# Altium footprint library Kelboy.PcbLib: 46 footprints (part 3 of 3)
Each footprint in its own frame and in the unit in brackets; x right, y up, seen from the top. Pads: shape width x height; smd on the part's side, far side on the other; paste and mask are expansions set on the pad; w line width, h text height; cw(c..) or ccw(c..) is an arc to the next point about the centre after c.
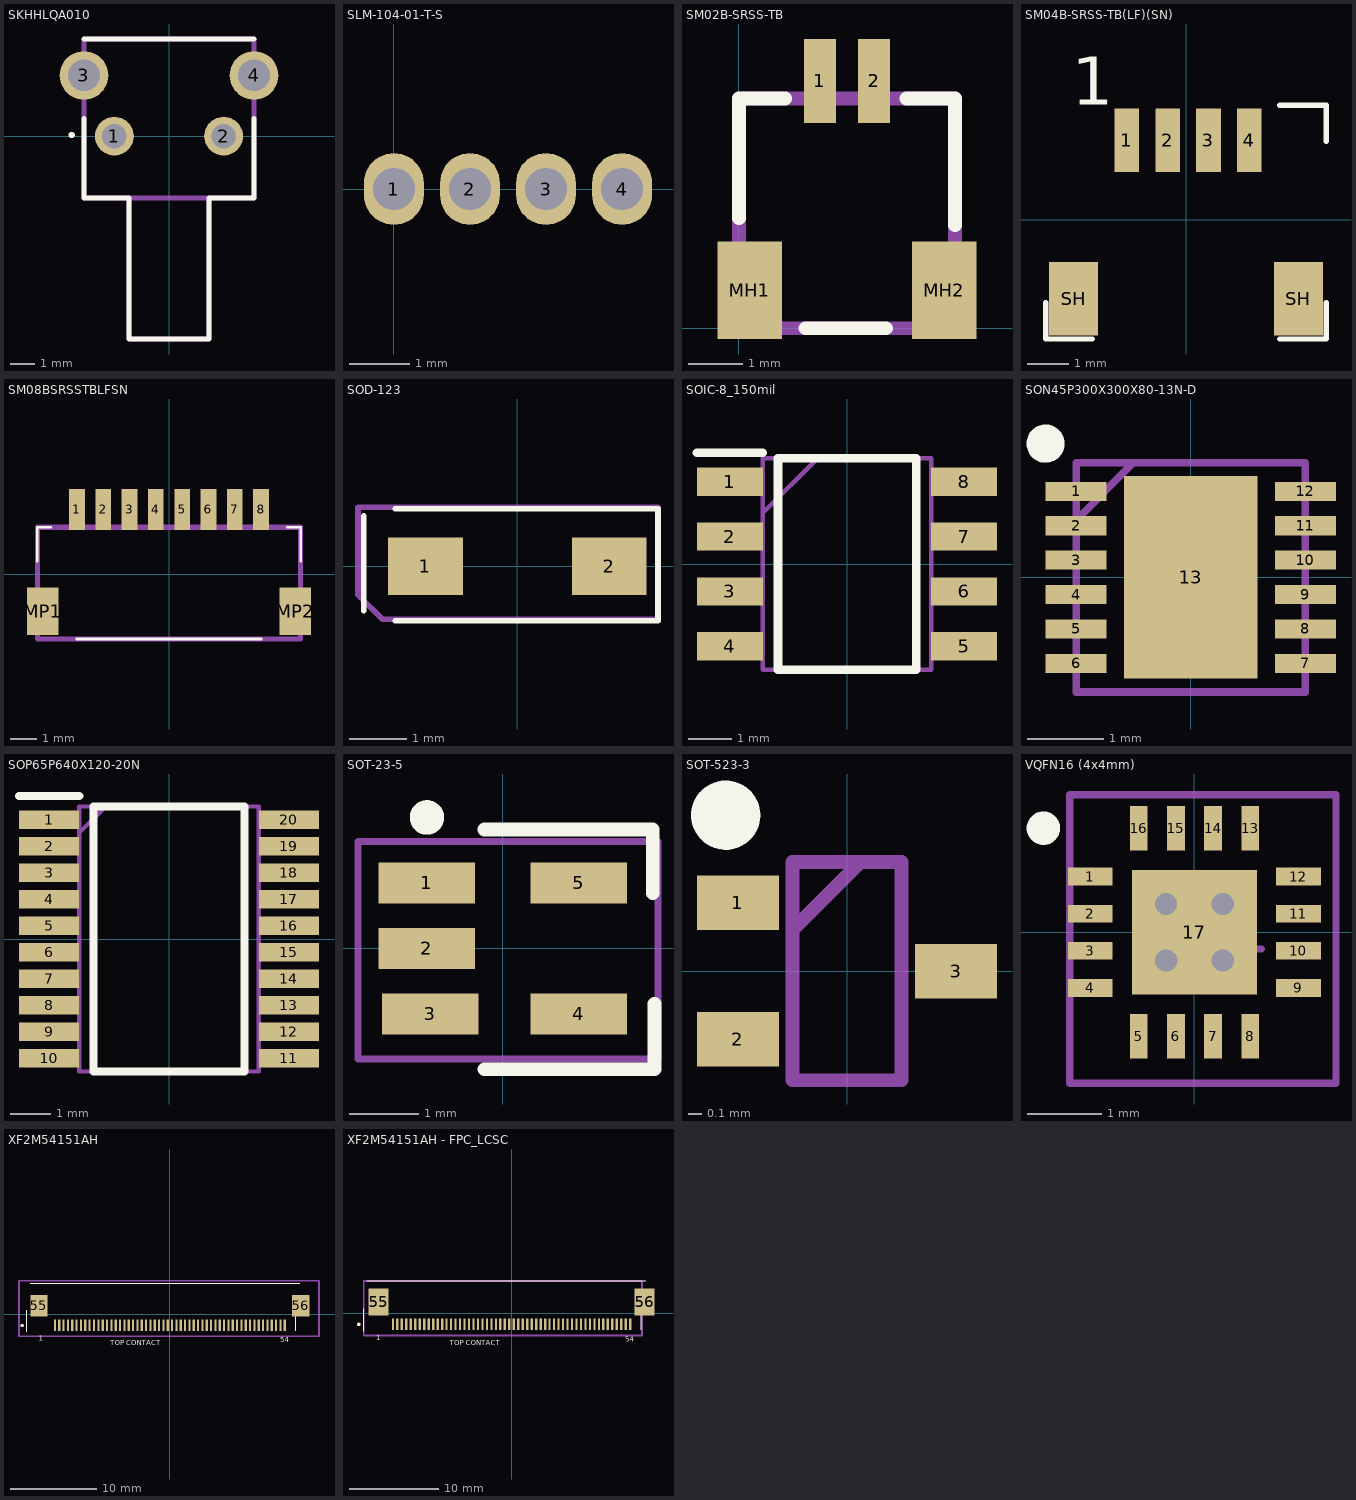
[diagram p2: the footprints below, top view; thin cyan lines are the x and y axes]

## SKHHLQA010 [mm]
pads (4):
  round 1.6 hole 1: 1(-2.25,0) 2(2.25,0)
  round 2 hole 1.3: 3(-3.5,2.5) 4(3.5,2.5)
Top Overlay:
  circle w0.2: c-4.01,0.048 r0.031
  lines w0.2: -3.5,0.725 -3.5,-2.55 -1.65,-2.55 -1.65,-8.35 1.65,-8.35 1.65,-2.55 3.5,-2.55 3.5,0.725 ; -3.5,4 3.5,4
Mechanical 13:
  lines w0.2: -1.65,-2.55 -1.65,-8.35 1.65,-8.35 1.65,-2.55 ; -3.5,-2.55 3.5,-2.55 3.5,4 -3.5,4 -3.5,-2.55
Mechanical 29:
  text ".Designator" at -1.905,0 h1
3D body "SKHHLQA010.stp": height 7.5, standoff -3.4, extent -4.25,-8.387 4.25,4.013

## SLM-104-01-T-S [mm]
pads (4):
  oval 1x1.2 hole 0.7: 1(0,0) 2(1.27,0) 3(2.54,0) 4(3.81,0)
Mechanical 29:
  text ".Designator" at -0.127,-0.254 h1
3D body "SLM-104-01-G-S.stp": height 4.57, standoff -2.92, extent -0.749,-1.27 4.559,1.27

## SM02B-SRSS-TB [mm]
pads (4):
  rect 0.6x1.55 smd: 1(1.5,4.575) 2(2.5,4.575)
  rect 1.2x1.8 smd: MH1(0.2,0.7) MH2(3.8,0.7)
Top Overlay:
  lines w0.254: 0,2.037 0,4.25 0.855,4.25 ; 1.233,0 2.722,0 ; 3.1,4.25 4,4.25 4,1.903
Mechanical 13:
  lines w0.254: 0,0 4,0 4,4.25 0,4.25 0,0
Mechanical 29:
  text ".Designator" at 0,2.475 h1
3D body "JST_SM02B-SRSS-TB.step": height 3, standoff 0, extent 0.038,0 4.026,4.987

## SM04B-SRSS-TB(LF)(SN) [mm]
pads (6):
  rect 0.6x1.55 smd: 1(-1.45,1.938) 2(-0.45,1.938) 3(0.55,1.938) 4(1.55,1.938)
  rect 1.2x1.8 smd: SH(-2.75,-1.937) SH(2.75,-1.937)
Top Overlay:
  lines w0.127: -3.429,-2.032 -3.429,-2.921 -2.286,-2.921 ; 2.286,-2.921 3.429,-2.921 3.429,-2.032 ; 2.286,2.794 3.429,2.794 3.429,1.905
  text "1" at -2.794,2.413 h2
3D body "SM04B-SRSS-TB(LF)(SN)--3DModel-STEP-56544.STEP": height 2.96, standoff 0, extent -3,-2.794 3,2.156

## SM08BSRSSTBLFSN [mm]
pads (10):
  rect 0.6x1.55 smd: 1(-3.5,2.463) 2(-2.5,2.463) 3(-1.5,2.463) 4(-0.5,2.463) 5(0.5,2.463) 6(1.5,2.463) 7(2.5,2.463) 8(3.5,2.463)
  rect 1.2x1.8 smd: MP1(-4.8,-1.413) MP2(4.8,-1.413)
Top Overlay:
  lines w0.1: -5,0.5 -5,1.787 -4.5,1.787 ; -3.5,-2.463 3.5,-2.463 ; 4.5,1.787 5,1.787 5,0.5
Mechanical 13:
  lines w0.2: -5,-2.463 -5,1.787 5,1.787 5,-2.463 -5,-2.463
Mechanical 29:
  text ".Designator" at -2.286,-1.27 h1
3D body "SM08B-SRSS-TB(LF)(SN)--3DModel-STEP-56544.STEP": height 3, standoff 0.05, extent -5,-2.032 5,2.918

## SOD-123 [mm]
pads (2):
  rect 1.3x1 smd: 1(-1.6,0) 2(1.6,0)
Top Overlay:
  lines w0.1: -2.675,-0.775 -2.675,0.875 ; -2.125,-0.95 2.45,-0.95 2.45,1 -2.125,1
Mechanical 29:
  lines w0.1: -2.775,-0.5 -2.775,1.025 2.45,1.025 2.45,-0.925 -2.35,-0.925 -2.775,-0.5
  text ".Designator" at -1.8,-0.35 h1
3D body "SOD-123FL.STEP": height 0.95, standoff 0, extent -1.825,-0.825 1.775,0.825

## SOIC-8_150mil [mm]
pads (8):
  rect 1.525x0.65 smd: 1(-2.712,1.905) 2(-2.712,0.635) 3(-2.712,-0.635) 4(-2.712,-1.905) 5(2.712,-1.905) 6(2.712,-0.635) 7(2.712,0.635) 8(2.712,1.905)
Top Overlay:
  lines w0.2: -3.475,2.58 -1.95,2.58 ; -1.6,-2.45 -1.6,2.45 1.6,2.45 1.6,-2.45 -1.6,-2.45
Mechanical 29:
  lines w0.1: -1.95,1.18 -0.68,2.45 ; -1.95,-2.45 1.95,-2.45 1.95,2.45 -1.95,2.45 -1.95,-2.45
  text ".Designator" at 48.78,-36.605 h1
3D body "NE555DR.stp": height 1.75, standoff 0, extent -3,-2.45 3,2.45

## SON45P300X300X80-13N-D [mm]
pads (13):
  rect 0.8x0.25 smd: 1(-1.5,1.125) 2(-1.5,0.675) 3(-1.5,0.225) 4(-1.5,-0.225) 5(-1.5,-0.675) 6(-1.5,-1.125) 7(1.5,-1.125) 8(1.5,-0.675) 9(1.5,-0.225) 10(1.5,0.225) 11(1.5,0.675) 12(1.5,1.125)
  rect 1.75x2.65 smd: 13(0,0)
Top Overlay:
  circle w0.25: c-1.9,1.75 r0.125
Mechanical 29:
  lines w0.1: -1.5,0.75 -0.75,1.5 ; -1.5,-1.5 -1.5,1.5 1.5,1.5 1.5,-1.5 -1.5,-1.5
  text ".Designator" at -1.143,-0.635 h1
3D body "RT8020AGQW.stp": height 0.8, standoff 0, extent -1.55,-1.5 1.55,1.5

## SOP65P640X120-20N [mm]
pads (20):
  rect 1.475x0.45 smd: 1(-2.938,2.925) 2(-2.938,2.275) 3(-2.938,1.625) 4(-2.938,0.975) 5(-2.938,0.325) 6(-2.938,-0.325) 7(-2.938,-0.975) 8(-2.938,-1.625) 9(-2.938,-2.275) 10(-2.938,-2.925) 11(2.938,-2.925) 12(2.938,-2.275) 13(2.938,-1.625) 14(2.938,-0.975) 15(2.938,-0.325) 16(2.938,0.325) 17(2.938,0.975) 18(2.938,1.625) 19(2.938,2.275) 20(2.938,2.925)
Top Overlay:
  lines w0.2: -3.675,3.5 -2.2,3.5 ; -1.85,-3.25 -1.85,3.25 1.85,3.25 1.85,-3.25 -1.85,-3.25
Mechanical 29:
  lines w0.1: -2.2,2.6 -1.55,3.25 ; -2.2,-3.25 2.2,-3.25 2.2,3.25 -2.2,3.25 -2.2,-3.25
  text ".Designator" at -1.905,-0.381 h1
3D body "PCM5102APWR.stp": height 1.2, standoff 0, extent -3.2,-3.25 3.2,3.25

## SOT-23-5 [mm] "SOT23, 3-Leads, Body 2.92x1.3mm, Pitch 0.95mm"
height 1.11
pads (5):
  rect 1.4x0.6 smd: 1(-1.1,0.95) 2(-1.1,0) 3(-1.05,-0.95) 4(1.1,-0.95) 5(1.1,0.95)
Top Overlay:
  circle w0.25: c-1.1,1.9 r0.125
  lines w0.2: -0.265,-1.75 2.2,-1.75 2.2,-0.8 ; -0.265,1.725 2.175,1.725 2.175,0.8
Mechanical 29:
  lines w0.1: -2.1,-1.6 -2.1,1.55 2.25,1.55 2.25,-1.6 -2.1,-1.6
  text ".Designator" at -0.9,1.125 h1
3D body "SOT-23-5.step": height 1.05, standoff -0.05, extent -1.175,-1.5 1.325,1.5

## SOT-523-3 [mm]
pads (3):
  rect 0.6x0.4 smd: 1(-0.8,0.5) 2(-0.8,-0.5) 3(0.8,0)
Top Overlay:
  circle w0.254: c-0.889,1.143 r0.127
Mechanical 29:
  lines w0.1: -0.4,0.3 0.1,0.8 ; -0.4,-0.8 -0.4,0.8 0.4,0.8 0.4,-0.8 -0.4,-0.8
  text ".Designator" at -1.397,-0.381 h1
3D body "DMG1012T-7.stp": height 0.8, standoff 0, extent -0.8,-0.8 0.8,0.8

## VQFN16 (4x4mm) [mm] "QFN, 16-Leads, Body 4,00x4,00mm,"
height 0.8
pads (17):
  rect 0.6x0.24 smd: 1(-1.4,0.75) 2(-1.4,0.25) 3(-1.4,-0.25) 4(-1.4,-0.75) 9(1.4,-0.75) 10(1.4,-0.25) 11(1.4,0.25) 12(1.4,0.75)
  rect 0.24x0.6 smd: 5(-0.75,-1.4) 6(-0.25,-1.4) 7(0.25,-1.4) 8(0.75,-1.4) 13(0.75,1.4) 14(0.25,1.4) 15(-0.25,1.4) 16(-0.75,1.4)
  rect 1.68x1.68 smd: 17(0,0)
via -0.384,0.381 diameter 0.5 hole 0.3
via 0.381,0.381 diameter 0.5 hole 0.3
via 0.381,-0.381 diameter 0.5 hole 0.3
via -0.381,-0.381 diameter 0.5 hole 0.3
Top Overlay:
  circle w0.25: c-2.032,1.4 r0.1
Mechanical 15:
  lines w0.1: -0.1,-0.225 0.9,-0.225 ; 0.4,-0.725 0.4,0.275
Mechanical 29:
  lines w0.1: -1.675,-2.032 1.905,-2.032 1.905,1.85 -1.675,1.85 -1.675,-2.032
  text ".Designator" at -1.124,-0.606 h1
3D body "BQ24076RGTT.stp": height 1, standoff 0, extent -1.55,-1.55 1.55,1.55

## XF2M54151AH [mm]
pads (56):
  rect 0.25x1.3 smd: 1(-13.25,-1.25) 2(-12.75,-1.25) 3(-12.25,-1.25) 4(-11.75,-1.25) 5(-11.25,-1.25) 6(-10.75,-1.25) 7(-10.25,-1.25) 8(-9.75,-1.25) 9(-9.25,-1.25) 10(-8.75,-1.25) 11(-8.25,-1.25) 12(-7.75,-1.25) 13(-7.25,-1.25) 14(-6.75,-1.25) 15(-6.25,-1.25) 16(-5.75,-1.25) 17(-5.25,-1.25) 18(-4.75,-1.25) 19(-4.25,-1.25) 20(-3.75,-1.25) 21(-3.25,-1.25) 22(-2.75,-1.25) 23(-2.25,-1.25) 24(-1.75,-1.25) 25(-1.25,-1.25) 26(-0.75,-1.25) 27(-0.25,-1.25) 28(0.25,-1.25) 29(0.75,-1.25) 30(1.25,-1.25) 31(1.75,-1.25) 32(2.25,-1.25) 33(2.75,-1.25) 34(3.25,-1.25) 35(3.75,-1.25) 36(4.25,-1.25) 37(4.75,-1.25) 38(5.25,-1.25) 39(5.75,-1.25) 40(6.25,-1.25) 41(6.75,-1.25) 42(7.25,-1.25) 43(7.75,-1.25) 44(8.25,-1.25) 45(8.75,-1.25) 46(9.25,-1.25) 47(9.75,-1.25) 48(10.25,-1.25) 49(10.75,-1.25) 50(11.25,-1.25) 51(11.75,-1.25) 52(12.25,-1.25) 53(12.75,-1.25) 54(13.25,-1.25)
  rect 2x2.5 smd: 55(-15.1,1) 56(15.1,1)
Top Overlay:
  lines w0.1: -16.494,-2.009 -16.494,0.491 ; -16.113,3.579 14.987,3.579 ; 14.494,-1.882 14.494,0.618
  lines w0.2: -17.145,-1.27 cw(c-17.045,-1.27) -16.945,-1.27 cw(c-17.045,-1.27) -17.042,-1.17
  text "TOP CONTACT" at -6.884,-3.79 h1
  text "1" at -15.097,-3.279 h1
  text "54" at 12.716,-3.406 h1
Mechanical 13:
  lines w0.2: -17.4,-2.517 -17.4,3.9 17.2,3.9 17.2,-2.517 -17.4,-2.517
Mechanical 29:
  text ".Designator" at -6.969,0.404 h1
3D body "f32q_54pin_asm.stp": height 2.1, standoff 0.05, extent -17.15,-1.55 17.15,3.95

## XF2M54151AH - FPC_LCSC [mm]
pads (56):
  rect 0.25x1.3 smd: 1(-13.25,-1.25) 2(-12.75,-1.25) 3(-12.25,-1.25) 4(-11.75,-1.25) 5(-11.25,-1.25) 6(-10.75,-1.25) 7(-10.25,-1.25) 8(-9.75,-1.25) 9(-9.25,-1.25) 10(-8.75,-1.25) 11(-8.25,-1.25) 12(-7.75,-1.25) 13(-7.25,-1.25) 14(-6.75,-1.25) 15(-6.25,-1.25) 16(-5.75,-1.25) 17(-5.25,-1.25) 18(-4.75,-1.25) 19(-4.25,-1.25) 20(-3.75,-1.25) 21(-3.25,-1.25) 22(-2.75,-1.25) 23(-2.25,-1.25) 24(-1.75,-1.25) 25(-1.25,-1.25) 26(-0.75,-1.25) 27(-0.25,-1.25) 28(0.25,-1.25) 29(0.75,-1.25) 30(1.25,-1.25) 31(1.75,-1.25) 32(2.25,-1.25) 33(2.75,-1.25) 34(3.25,-1.25) 35(3.75,-1.25) 36(4.25,-1.25) 37(4.75,-1.25) 38(5.25,-1.25) 39(5.75,-1.25) 40(6.25,-1.25) 41(6.75,-1.25) 42(7.25,-1.25) 43(7.75,-1.25) 44(8.25,-1.25) 45(8.75,-1.25) 46(9.25,-1.25) 47(9.75,-1.25) 48(10.25,-1.25) 49(10.75,-1.25) 50(11.25,-1.25) 51(11.75,-1.25) 52(12.25,-1.25) 53(12.75,-1.25) 54(13.25,-1.25)
  rect 2.2x3 smd: 55(-14.85,1.25) 56(14.85,1.25)
Top Overlay:
  lines w0.1: -16.494,-2.009 -16.494,0.491 ; -16.113,3.579 14.987,3.579 ; 14.494,-1.882 14.494,0.618
  lines w0.2: -17.145,-1.27 cw(c-17.045,-1.27) -16.945,-1.27 cw(c-17.045,-1.27) -17.042,-1.17
  text "54" at 12.716,-3.406 h1
  text "1" at -15.097,-3.279 h1
  text "TOP CONTACT" at -6.884,-3.79 h1
Mechanical 13:
  lines w0.2: -16.494,-2.517 14.55,-2.517 14.55,3.579 -16.494,3.579 -16.494,-2.517
Mechanical 29:
  text ".Designator" at -6.969,0.404 h1
3D body "XF2M_5415_1AH.STEP": height 2.1, standoff 0, extent -15.605,-2.569 15.495,3.631